# Altium footprint library ICs And Semiconductors SMD.PcbLib: 602 footprints (part 26 of 38)
Each footprint in its own frame and in the unit in brackets; x right, y up, seen from the top. Pads: shape width x height; smd on the part's side, far side on the other; paste and mask are expansions set on the pad; w line width, h text height; cw(c..) or ccw(c..) is an arc to the next point about the centre after c.
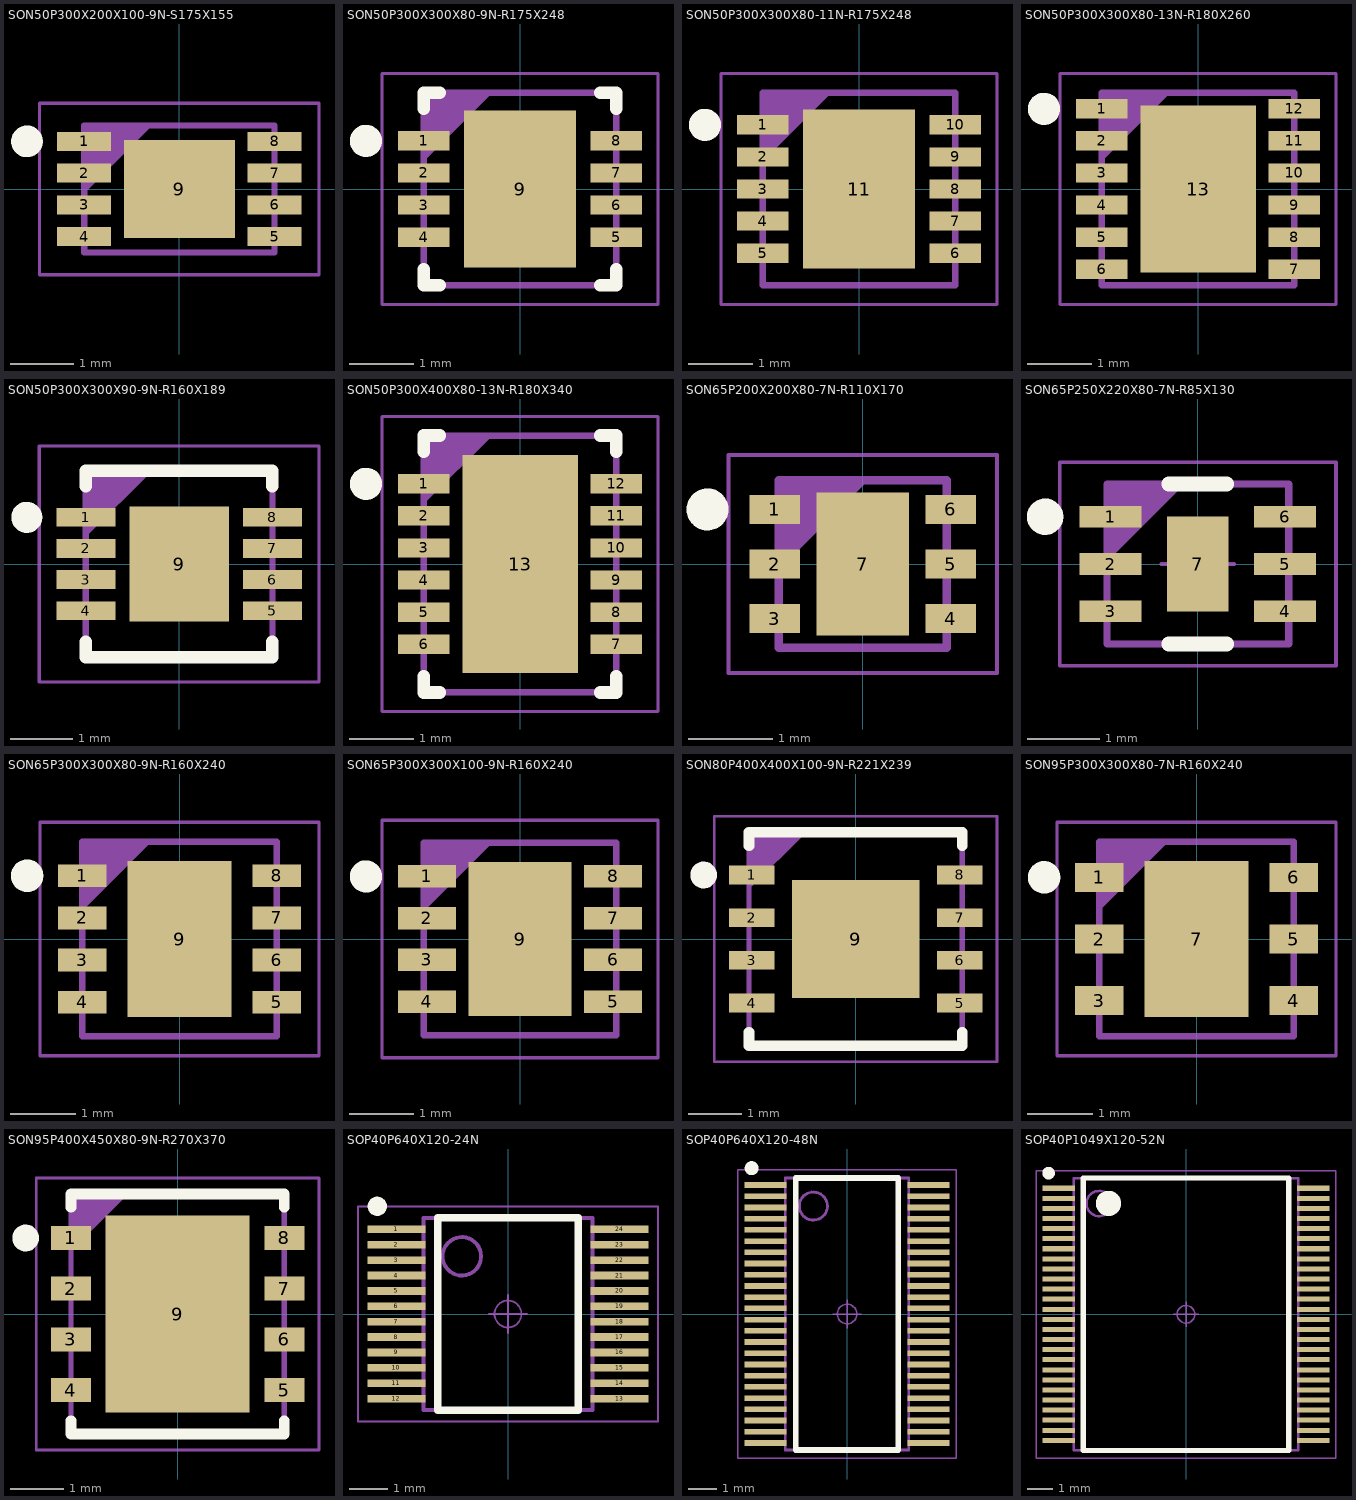
[diagram p25: the footprints below, top view; thin cyan lines are the x and y axes]

## SON50P300X200X100-9N-S175X155 [mm] "SON (DFN), 0.50mm pitch, 8 pin, 2mm X 3mm X 1.00mm H body (w/thermal tab 1.75 X 1.55mm),  IPC Medium Density"
height 1
pads (9):
  rect 0.85x0.3 smd: 1(-1.5,0.75) 2(-1.5,0.25) 3(-1.5,-0.25) 4(-1.5,-0.75) 5(1.5,-0.75) 6(1.5,-0.25) 7(1.5,0.25) 8(1.5,0.75)
  rect 1.75x1.55 smd: 9(0,0)
Top Overlay:
  circle w0.25: c-2.4,0.75 r0.125
Mechanical 14:
  lines w0.1: -1.5,0 -0.5,1 ; -1.5,0.1 -0.6,1 ; -1.5,0.2 -0.7,1 ; -1.5,0.3 -0.8,1 ; -1.5,0.4 -0.9,1 ; -1.5,0.5 -1,1 ; -1.5,0.6 -1.1,1 ; -1.5,0.7 -1.2,1 ; -1.5,0.8 -1.3,1 ; -1.5,0.9 -1.4,1 ; -1.5,-1 1.5,-1 1.5,1 -1.5,1 -1.5,-1
Mechanical 15:
  lines w0.05: -2.2,-1.35 2.2,-1.35 2.2,1.35 -2.2,1.35 -2.2,-1.35
3D body "SON50P300X200X100-9N-S175X155.stp": height 1.02, standoff 0, extent -1.5,-1 1.5,1

## SON50P300X300X80-9N-R175X248 [mm] "SON, (DFN) 0.50mm,pitch; 8 pin,3.00mm W X 3.00mm L X 0.80mm H body (w/thermal tab 1.75 X2.48mm), IPC Medium Density"
height 0.8
pads (9):
  rect 0.8x0.3 smd: 1(-1.5,0.75) 2(-1.5,0.25) 3(-1.5,-0.25) 4(-1.5,-0.75) 5(1.5,-0.75) 6(1.5,-0.25) 7(1.5,0.25) 8(1.5,0.75)
  rect 1.75x2.45 smd: 9(0,0)
Top Overlay:
  circle w0.25: c-2.4,0.75 r0.125
  lines w0.2: -1.5,-1.25 -1.5,-1.5 -1.25,-1.5 ; -1.5,1.25 -1.5,1.5 -1.25,1.5 ; 1.25,-1.5 1.5,-1.5 1.5,-1.25 ; 1.25,1.5 1.5,1.5 1.5,1.25
Mechanical 14:
  lines w0.1: -1.5,0.5 -0.5,1.5 ; -1.5,0.6 -0.6,1.5 ; -1.5,0.7 -0.7,1.5 ; -1.5,0.8 -0.8,1.5 ; -1.5,0.9 -0.9,1.5 ; -1.5,1 -1,1.5 ; -1.5,1.1 -1.1,1.5 ; -1.5,1.2 -1.2,1.5 ; -1.5,1.3 -1.3,1.5 ; -1.5,1.4 -1.4,1.5 ; -1.5,-1.5 1.5,-1.5 1.5,1.5 -1.5,1.5 -1.5,-1.5
Mechanical 15:
  lines w0.05: -0.5,0 0.5,0 ; 0,-0.5 0,0.5 ; -2.15,-1.8 -2.15,1.8 2.15,1.8 2.15,-1.8 -2.15,-1.8
3D body "SON50P300X300X80-9N-R175X248.stp": height 0.8, standoff 0, extent -1.55,-1.55 1.55,1.55

## SON50P300X300X80-11N-R175X248 [mm] "SON, 0.50mm Pitch, 10-pin, 3.00mm W  X 3.00mm L X 0.80mm Height, (w/thermal tab 1.75 X 2.48 mm), IPC Medium Density"
height 0.8
pads (11):
  rect 0.8x0.3 smd: 1(-1.5,1) 2(-1.5,0.5) 3(-1.5,0) 4(-1.5,-0.5) 5(-1.5,-1) 6(1.5,-1) 7(1.5,-0.5) 8(1.5,0) 9(1.5,0.5) 10(1.5,1)
  rect 1.75x2.48 smd: 11(0,0)
Top Overlay:
  circle w0.25: c-2.4,1 r0.125
Mechanical 14:
  lines w0.1: -1.5,0.5 -0.5,1.5 ; -1.5,0.6 -0.6,1.5 ; -1.5,0.7 -0.7,1.5 ; -1.5,0.8 -0.8,1.5 ; -1.5,0.9 -0.9,1.5 ; -1.5,1 -1,1.5 ; -1.5,1.1 -1.1,1.5 ; -1.5,1.2 -1.2,1.5 ; -1.5,1.3 -1.3,1.5 ; -1.5,1.4 -1.4,1.5 ; -1.5,-1.5 1.5,-1.5 1.5,1.5 -1.5,1.5 -1.5,-1.5
Mechanical 15:
  circle w0.05: c0,0 r0.35
  lines w0.05: -0.5,0 0.5,0 ; 0,-0.5 0,0.5 ; -2.15,-1.8 -2.15,1.8 2.15,1.8 2.15,-1.8 -2.15,-1.8
3D body "SON50P300X300X80-11N-R175X248.stp": height 0.8, standoff 0, extent -1.5,-1.5 1.5,1.5

## SON50P300X300X80-13N-R180X260 [mm] "SON, 0.50mm Pitch, 12-Pin, 3.00mm W  X 3.00mm L X 0.80mm Height, (w/Thermal Tab 1.8 X 2.6 mm), IPC Medium Density"
height 0.8
pads (13):
  rect 0.8x0.3 smd: 1(-1.5,1.25) 2(-1.5,0.75) 3(-1.5,0.25) 4(-1.5,-0.25) 5(-1.5,-0.75) 6(-1.5,-1.25) 7(1.5,-1.25) 8(1.5,-0.75) 9(1.5,-0.25) 10(1.5,0.25) 11(1.5,0.75) 12(1.5,1.25)
  rect 1.8x2.6 smd: 13(0,0)
Top Overlay:
  circle w0.25: c-2.4,1.25 r0.125
Mechanical 14:
  lines w0.1: -1.5,0.5 -0.5,1.5 ; -1.5,0.6 -0.6,1.5 ; -1.5,0.7 -0.7,1.5 ; -1.5,0.8 -0.8,1.5 ; -1.5,0.9 -0.9,1.5 ; -1.5,1 -1,1.5 ; -1.5,1.1 -1.1,1.5 ; -1.5,1.2 -1.2,1.5 ; -1.5,1.3 -1.3,1.5 ; -1.5,1.4 -1.4,1.5 ; -1.5,-1.5 -1.5,1.5 1.5,1.5 1.5,-1.5 -1.5,-1.5
Mechanical 15:
  circle w0.05: c0,0 r0.35
  lines w0.05: -0.5,0 0.5,0 ; 0,-0.5 0,0.5 ; -2.15,-1.8 2.15,-1.8 2.15,1.8 -2.15,1.8 -2.15,-1.8
3D body "SON50P300X300X80-13N-R180X260.stp": height 0.8, standoff 0, extent -1.55,-1.55 1.55,1.55

## SON50P300X300X90-9N-R160X189 [mm] "SON (DFN), 0.50mm pitch, 8 pin, 3mm X 3mm X 0.9mm H body (w/thermal tab 1.6 X 1.89mm),  IPC Medium Density"
height 0.9
pads (9):
  rect 0.95x0.3 smd: 1(-1.5,0.75) 2(-1.5,0.25) 3(-1.5,-0.25) 4(-1.5,-0.75) 5(1.5,-0.75) 6(1.5,-0.25) 7(1.5,0.25) 8(1.5,0.75)
  rect 1.6x1.85 smd: 9(0,0)
Top Overlay:
  circle w0.25: c-2.45,0.75 r0.125
  lines w0.2: -1.5,-1.25 -1.5,-1.5 1.5,-1.5 1.5,-1.25 ; -1.5,1.25 -1.5,1.5 1.5,1.5 1.5,1.25
Mechanical 14:
  lines w0.1: -1.5,0.5 -0.5,1.5 ; -1.5,0.6 -0.6,1.5 ; -1.5,0.7 -0.7,1.5 ; -1.5,0.8 -0.8,1.5 ; -1.5,0.9 -0.9,1.5 ; -1.5,1 -1,1.5 ; -1.5,1.1 -1.1,1.5 ; -1.5,1.2 -1.2,1.5 ; -1.5,1.3 -1.3,1.5 ; -1.5,1.4 -1.4,1.5 ; -1.5,-1.5 -1.5,1.5 1.5,1.5 1.5,-1.5 -1.5,-1.5
Mechanical 15:
  lines w0.05: -0.5,0 0.5,0 ; 0,-0.5 0,0.5 ; -2.25,-1.9 2.25,-1.9 2.25,1.9 -2.25,1.9 -2.25,-1.9
3D body "SON50P300X300X90-9N-R160X189.stp": height 0.9, standoff 0, extent -1.625,-1.625 1.625,1.625

## SON50P300X400X80-13N-R180X340 [mm] "SON, (DFN) 0.50mm,pitch;12 pin,3.00mm W X 4.00mm L X 0.80mm H body (w/thermal tab 1.8 X3.4mm), IPC Medium Density"
height 0.8
pads (13):
  rect 0.8x0.3 smd: 1(-1.5,1.25) 2(-1.5,0.75) 3(-1.5,0.25) 4(-1.5,-0.25) 5(-1.5,-0.75) 6(-1.5,-1.25) 7(1.5,-1.25) 8(1.5,-0.75) 9(1.5,-0.25) 10(1.5,0.25) 11(1.5,0.75) 12(1.5,1.25)
  rect 1.8x3.4 smd: 13(0,0)
Top Overlay:
  circle w0.25: c-2.4,1.25 r0.125
  lines w0.2: -1.5,-1.75 -1.5,-2 -1.25,-2 ; -1.5,1.75 -1.5,2 -1.25,2 ; 1.25,-2 1.5,-2 1.5,-1.75 ; 1.25,2 1.5,2 1.5,1.75
Mechanical 14:
  lines w0.1: -1.5,1 -0.5,2 ; -1.5,1.1 -0.6,2 ; -1.5,1.2 -0.7,2 ; -1.5,1.3 -0.8,2 ; -1.5,1.4 -0.9,2 ; -1.5,1.5 -1,2 ; -1.5,1.6 -1.1,2 ; -1.5,1.7 -1.2,2 ; -1.5,1.8 -1.3,2 ; -1.5,1.9 -1.4,2 ; -1.5,-2 -1.5,2 1.5,2 1.5,-2 -1.5,-2
Mechanical 15:
  lines w0.05: -0.5,0 0.5,0 ; 0,-0.5 0,0.5 ; -2.15,-2.3 -2.15,2.3 2.15,2.3 2.15,-2.3 -2.15,-2.3
3D body "SON50P300X400X80-13N-R180X340.stp": height 0.8, standoff 0, extent -1.55,-2.05 1.55,2.05

## SON65P200X200X80-7N-R110X170 [mm] "SON, 0.65mm, Pitch; 6 Pin,2.00mm W X 2.00mm L X 0.80mm H body (W/Thermal Tab 1.1mm X 1.7mm),  IPC Medium Density"
height 0.8
pads (7):
  rect 0.6x0.35 smd: 1(-1.05,0.65) 2(-1.05,0) 3(-1.05,-0.65) 4(1.05,-0.65) 5(1.05,0) 6(1.05,0.65)
  rect 1.1x1.7 smd: 7(0,0)
Top Overlay:
  circle w0.25: c-1.85,0.65 r0.125
Top Paste:
  region: -0.308,0.608 0.307,0.608 0.307,-0.607 -0.308,-0.607
Mechanical 14:
  lines w0.1: -1,0 0,1 ; -1,0.1 -0.1,1 ; -1,0.2 -0.2,1 ; -1,0.3 -0.3,1 ; -1,0.4 -0.4,1 ; -1,0.5 -0.5,1 ; -1,0.6 -0.6,1 ; -1,0.7 -0.7,1 ; -1,0.8 -0.8,1 ; -1,0.9 -0.9,1 ; -1,-1 1,-1 1,1 -1,1 -1,-1
Mechanical 15:
  circle w0.05: c0,0 r0.35
  lines w0.05: -0.5,0 0.5,0 ; 0,-0.5 0,0.5 ; -1.6,-1.3 -1.6,1.3 1.6,1.3 1.6,-1.3 -1.6,-1.3
3D body "SON65P200X200X80-7N-R110X170.stp": height 0.77, standoff 0, extent -1.05,-1.05 1.05,1.05

## SON65P250X220X80-7N-R85X130 [mm] "SON, 0.65mm, Pitch; 6 Pin, 2.50mm W X 2.20mm L X 0.80mm H Body (W/Thermal Tab 0.75 X 1.2mm) (w/pullback leads),  IPC Medium Density"
height 0.8
pads (7):
  rect 0.85x0.3 smd: 1(-1.2,0.65) 2(-1.2,0) 3(-1.2,-0.65) 4(1.2,-0.65) 5(1.2,0) 6(1.2,0.65)
  rect 0.85x1.3 smd: 7(0,0)
Top Overlay:
  circle w0.25: c-2.1,0.65 r0.125
  lines w0.2: -0.4,-1.1 0.4,-1.1 ; -0.4,1.1 0.4,1.1
Mechanical 14:
  lines w0.1: -1.25,0.1 -0.25,1.1 ; -1.25,0.2 -0.35,1.1 ; -1.25,0.3 -0.45,1.1 ; -1.25,0.4 -0.55,1.1 ; -1.25,0.5 -0.65,1.1 ; -1.25,0.6 -0.75,1.1 ; -1.25,0.7 -0.85,1.1 ; -1.25,0.8 -0.95,1.1 ; -1.25,0.9 -1.05,1.1 ; -1.25,1 -1.15,1.1 ; -1.25,-1.1 1.25,-1.1 1.25,1.1 -1.25,1.1 -1.25,-1.1
Mechanical 15:
  circle w0.05: c0,0 r0.35
  lines w0.05: -0.5,0 0.5,0 ; 0,-0.5 0,0.5 ; -1.9,-1.4 1.9,-1.4 1.9,1.4 -1.9,1.4 -1.9,-1.4
3D body "SON65P250X220X80-7N-R85X130.stp": height 0.8, standoff 0, extent -1.3,-1.15 1.3,1.15

## SON65P300X300X80-9N-R160X240 [mm] "SON, 0.65mm pitch, 8 pin, 3mm X 3mm X 0.80mm H body (w/thermal tab 1.60 X 2.4mm),  IPC Medium Density"
height 0.8
pads (9):
  rect 0.75x0.35 smd: 1(-1.5,0.975) 2(-1.5,0.325) 3(-1.5,-0.325) 4(-1.5,-0.975) 5(1.5,-0.975) 6(1.5,-0.325) 7(1.5,0.325) 8(1.5,0.975)
  rect 1.6x2.4 smd paste-0.35: 9(0,0)
Top Overlay:
  circle w0.25: c-2.35,0.975 r0.125
Mechanical 14:
  lines w0.1: -1.5,0.5 -0.5,1.5 ; -1.5,0.6 -0.6,1.5 ; -1.5,0.7 -0.7,1.5 ; -1.5,0.8 -0.8,1.5 ; -1.5,0.9 -0.9,1.5 ; -1.5,1 -1,1.5 ; -1.5,1.1 -1.1,1.5 ; -1.5,1.2 -1.2,1.5 ; -1.5,1.3 -1.3,1.5 ; -1.5,1.4 -1.4,1.5 ; -1.5,-1.5 1.5,-1.5 1.5,1.5 -1.5,1.5 -1.5,-1.5
Mechanical 15:
  circle w0.05: c0,0 r0.35
  lines w0.05: -0.5,0 0.5,0 ; 0,-0.5 0,0.5 ; -2.15,-1.8 -2.15,1.8 2.15,1.8 2.15,-1.8 -2.15,-1.8
3D body "SON65P300X300X80-9N-R160X240.stp": height 0.8, standoff 0, extent -1.5,-1.5 1.5,1.5

## SON65P300X300X100-9N-R160X240 [mm] "SON, 0.65mm pitch, 8 pin, 3mm X 3mm X 1.00mm H body (w/thermal tab 1.60 X 2.4mm),  IPC Medium Density"
height 1
pads (9):
  rect 0.9x0.35 smd: 1(-1.45,0.975) 2(-1.45,0.325) 3(-1.45,-0.325) 4(-1.45,-0.975) 5(1.45,-0.975) 6(1.45,-0.325) 7(1.45,0.325) 8(1.45,0.975)
  rect 1.6x2.4 smd: 9(0,0)
Top Overlay:
  circle w0.25: c-2.4,0.975 r0.125
Mechanical 14:
  lines w0.1: -1.5,0.5 -0.5,1.5 ; -1.5,0.6 -0.6,1.5 ; -1.5,0.7 -0.7,1.5 ; -1.5,0.8 -0.8,1.5 ; -1.5,0.9 -0.9,1.5 ; -1.5,1 -1,1.5 ; -1.5,1.1 -1.1,1.5 ; -1.5,1.2 -1.2,1.5 ; -1.5,1.3 -1.3,1.5 ; -1.5,1.4 -1.4,1.5 ; -1.5,-1.5 -1.5,1.5 1.5,1.5 1.5,-1.5 -1.5,-1.5
Mechanical 15:
  circle w0.05: c0,0 r0.35
  lines w0.05: -0.5,0 0.5,0 ; 0,-0.5 0,0.5 ; -2.15,-1.85 2.15,-1.85 2.15,1.85 -2.15,1.85 -2.15,-1.85
3D body "SON65P300X300X100-9N-R160X240.stp": height 1, standoff 0, extent -1.5,-1.5 1.5,1.5

## SON80P400X400X100-9N-R221X239 [mm] "SON, 0.80mm Pitch, 8 Pin, 4mm X 4mm X 1.00mm H Body (w/Thermal Tab 2.21 X 2.39mm),  IPC Medium Density"
height 1
pads (9):
  rect 0.85x0.35 smd: 1(-1.95,1.2) 2(-1.95,0.4) 3(-1.95,-0.4) 4(-1.95,-1.2) 5(1.95,-1.2) 6(1.95,-0.4) 7(1.95,0.4) 8(1.95,1.2)
  rect 2.39x2.21 smd: 9(0,0)
Top Overlay:
  circle w0.25: c-2.85,1.2 r0.125
  lines w0.2: -2,-1.75 -2,-2 2,-2 2,-1.75 ; -2,1.75 -2,2 2,2 2,1.75
Mechanical 14:
  lines w0.1: -2,1 -1,2 ; -2,1.1 -1.1,2 ; -2,1.2 -1.2,2 ; -2,1.3 -1.3,2 ; -2,1.4 -1.4,2 ; -2,1.5 -1.5,2 ; -2,1.6 -1.6,2 ; -2,1.7 -1.7,2 ; -2,1.8 -1.8,2 ; -2,1.9 -1.9,2 ; -2,-2 -2,2 2,2 2,-2 -2,-2
Mechanical 15:
  circle w0.05: c0,0 r0.35
  lines w0.05: -0.5,0 0.5,0 ; 0,-0.5 0,0.5 ; -2.65,-2.3 2.65,-2.3 2.65,2.3 -2.65,2.3 -2.65,-2.3
3D body "SON80P400X400X100-9N-R221X239.stp": height 1, standoff 0, extent -2,-2 2,2

## SON95P300X300X80-7N-R160X240 [mm] "SON, 0.95mm Pitch; 6 Pin, 3.00mm W X 3mm L X 0.80mm H body (w/Thermal Tab 1.6mm x 2.4mm)"
height 0.8
pads (7):
  rect 0.75x0.45 smd: 1(-1.5,0.95) 2(-1.5,0) 3(-1.5,-0.95) 4(1.5,-0.95) 5(1.5,0) 6(1.5,0.95)
  rect 1.6x2.4 smd: 7(0,0)
Top Overlay:
  circle w0.25: c-2.35,0.95 r0.125
Mechanical 14:
  lines w0.1: -1.5,0.5 -0.5,1.5 ; -1.5,0.6 -0.6,1.5 ; -1.5,0.7 -0.7,1.5 ; -1.5,0.8 -0.8,1.5 ; -1.5,0.9 -0.9,1.5 ; -1.5,1 -1,1.5 ; -1.5,1.1 -1.1,1.5 ; -1.5,1.2 -1.2,1.5 ; -1.5,1.3 -1.3,1.5 ; -1.5,1.4 -1.4,1.5 ; -1.5,-1.5 1.5,-1.5 1.5,1.5 -1.5,1.5 -1.5,-1.5
Mechanical 15:
  circle w0.05: c0,0 r0.35
  lines w0.05: -0.5,0 0.5,0 ; 0,-0.5 0,0.5 ; -2.15,-1.8 -2.15,1.8 2.15,1.8 2.15,-1.8 -2.15,-1.8
3D body "SON95P300X300X80-7N-R160X240.stp": height 0.8, standoff 0, extent -1.55,-1.55 1.55,1.55

## SON95P400X450X80-9N-R270X370 [mm] "SON, 0.95mm Pitch; 8 Pin, 4.00mm W X 4.50mm L X 0.80mm H body (w/Thermal Tab 2.7mm x 3.7mm)"
height 0.8
pads (9):
  rect 0.75x0.45 smd: 1(-2,1.425) 2(-2,0.475) 3(-2,-0.475) 4(-2,-1.425) 5(2,-1.425) 6(2,-0.475) 7(2,0.475) 8(2,1.425)
  rect 2.7x3.7 smd paste-0.57: 9(0,0)
Top Overlay:
  circle w0.25: c-2.85,1.425 r0.125
  lines w0.2: -2,-2 -2,-2.25 2,-2.25 2,-2 ; -2,2 -2,2.25 2,2.25 2,2
Mechanical 14:
  lines w0.1: -2,1.25 -1,2.25 ; -2,1.35 -1.1,2.25 ; -2,1.45 -1.2,2.25 ; -2,1.55 -1.3,2.25 ; -2,1.65 -1.4,2.25 ; -2,1.75 -1.5,2.25 ; -2,1.85 -1.6,2.25 ; -2,1.95 -1.7,2.25 ; -2,2.05 -1.8,2.25 ; -2,2.15 -1.9,2.25 ; -2,-2.25 2,-2.25 2,2.25 -2,2.25 -2,-2.25
Mechanical 15:
  circle w0.05: c0,0 r0.35
  lines w0.05: -0.5,0 0.5,0 ; 0,-0.5 0,0.5 ; -2.65,-2.55 2.65,-2.55 2.65,2.55 -2.65,2.55 -2.65,-2.55
3D body "SON95P400X450X80-9N-R270X370.stp": height 0.8, standoff 0, extent -2.05,-2.3 2.05,2.3

## SOP40P640X120-24N [mm] "SOP, 0.40mm Pitch; 24 pin, 4.40mm W X 5.00mm L X 1.20mm H Body, IPC Medium Density"
height 1.2
pads (24):
  rect 1.5x0.2 smd: 1(-2.9,2.2) 2(-2.9,1.8) 3(-2.9,1.4) 4(-2.9,1) 5(-2.9,0.6) 6(-2.9,0.2) 7(-2.9,-0.2) 8(-2.9,-0.6) 9(-2.9,-1) 10(-2.9,-1.4) 11(-2.9,-1.8) 12(-2.9,-2.2) 13(2.9,-2.2) 14(2.9,-1.8) 15(2.9,-1.4) 16(2.9,-1) 17(2.9,-0.6) 18(2.9,-0.2) 19(2.9,0.2) 20(2.9,0.6) 21(2.9,1) 22(2.9,1.4) 23(2.9,1.8) 24(2.9,2.2)
Top Overlay:
  circle w0.25: c-3.4,2.8 r0.125
  lines w0.2: -1.825,-2.5 1.825,-2.5 1.825,2.5 -1.825,2.5 -1.825,-2.5
Mechanical 14:
  circle w0.1: c-1.2,1.5 r0.5
  lines w0.1: -2.2,-2.5 2.2,-2.5 2.2,2.5 -2.2,2.5 -2.2,-2.5
Mechanical 15:
  circle w0.05: c0,0 r0.35
  lines w0.05: -0.5,0 0.5,0 ; 0,-0.5 0,0.5 ; -3.9,-2.8 3.9,-2.8 3.9,2.8 -3.9,2.8 -3.9,-2.8
3D body "SOP40P640X120-24N.stp": height 1.2, standoff 0, extent -3.3,-2.5 3.3,2.5

## SOP40P640X120-48N [mm] "SOP, 0.40mm Pitch; 48 Pin, 4.40mm W X 9.70mm L X 1.20mm H Body, IPC Medium Density"
height 1.2
pads (48):
  rect 1.5x0.2 smd: 1(-2.9,4.6) 2(-2.9,4.2) 3(-2.9,3.8) 4(-2.9,3.4) 5(-2.9,3) 6(-2.9,2.6) 7(-2.9,2.2) 8(-2.9,1.8) 9(-2.9,1.4) 10(-2.9,1) 11(-2.9,0.6) 12(-2.9,0.2) 13(-2.9,-0.2) 14(-2.9,-0.6) 15(-2.9,-1) 16(-2.9,-1.4) 17(-2.9,-1.8) 18(-2.9,-2.2) 19(-2.9,-2.6) 20(-2.9,-3) 21(-2.9,-3.4) 22(-2.9,-3.8) 23(-2.9,-4.2) 24(-2.9,-4.6) 25(2.9,-4.6) 26(2.9,-4.2) 27(2.9,-3.8) 28(2.9,-3.4) 29(2.9,-3) 30(2.9,-2.6) 31(2.9,-2.2) 32(2.9,-1.8) 33(2.9,-1.4) 34(2.9,-1) 35(2.9,-0.6) 36(2.9,-0.2) 37(2.9,0.2) 38(2.9,0.6) 39(2.9,1) 40(2.9,1.4) 41(2.9,1.8) 42(2.9,2.2) 43(2.9,2.6) 44(2.9,3) 45(2.9,3.4) 46(2.9,3.8) 47(2.9,4.2) 48(2.9,4.6)
Top Overlay:
  circle w0.25: c-3.4,5.2 r0.125
  lines w0.2: -1.825,-4.85 -1.825,4.85 1.825,4.85 1.825,-4.85 -1.825,-4.85
Mechanical 14:
  circle w0.1: c-1.2,3.85 r0.5
  lines w0.1: -2.2,-4.85 -2.2,4.85 2.2,4.85 2.2,-4.85 -2.2,-4.85
Mechanical 15:
  circle w0.05: c0,0 r0.35
  lines w0.05: -0.5,0 0.5,0 ; 0,-0.5 0,0.5 ; -3.9,-5.15 -3.9,5.15 3.9,5.15 3.9,-5.15 -3.9,-5.15
3D body "SOP40P640X120-48N.stp": height 1.2, standoff 0, extent -3.3,-4.85 3.3,4.85

## SOP40P1049X120-52N [mm] "SOP, 0.40mm Pitch; 52 Pin, 8.89mm W X 10.79mm L X 1.20mm H Body, IPC Medium Density"
height 1.2
pads (52):
  rect 1.3x0.2 smd: 1(-5.05,5) 2(-5.05,4.6) 3(-5.05,4.2) 4(-5.05,3.8) 5(-5.05,3.4) 6(-5.05,3) 7(-5.05,2.6) 8(-5.05,2.2) 9(-5.05,1.8) 10(-5.05,1.4) 11(-5.05,1) 12(-5.05,0.6) 13(-5.05,0.2) 14(-5.05,-0.2) 15(-5.05,-0.6) 16(-5.05,-1) 17(-5.05,-1.4) 18(-5.05,-1.8) 19(-5.05,-2.2) 20(-5.05,-2.6) 21(-5.05,-3) 22(-5.05,-3.4) 23(-5.05,-3.8) 24(-5.05,-4.2) 25(-5.05,-4.6) 26(-5.05,-5) 27(5.05,-5) 28(5.05,-4.6) 29(5.05,-4.2) 30(5.05,-3.8) 31(5.05,-3.4) 32(5.05,-3) 33(5.05,-2.6) 34(5.05,-2.2) 35(5.05,-1.8) 36(5.05,-1.4) 37(5.05,-1) 38(5.05,-0.6) 39(5.05,-0.2) 40(5.05,0.2) 41(5.05,0.6) 42(5.05,1) 43(5.05,1.4) 44(5.05,1.8) 45(5.05,2.2) 46(5.05,2.6) 47(5.05,3) 48(5.05,3.4) 49(5.05,3.8) 50(5.05,4.2) 51(5.05,4.6) 52(5.05,5)
Top Overlay:
  circle w0.25: c-5.45,5.6 r0.125
  circle w0.5: c-3.075,4.4 r0.25
  lines w0.2: -4.075,-5.4 -4.075,5.4 4.075,5.4 4.075,-5.4 -4.075,-5.4
Mechanical 14:
  circle w0.1: c-3.445,4.395 r0.5
  lines w0.1: -4.445,-5.395 -4.445,5.395 4.445,5.395 4.445,-5.395 -4.445,-5.395
Mechanical 15:
  circle w0.05: c0,0 r0.35
  lines w0.05: -0.5,0 0.5,0 ; 0,-0.5 0,0.5 ; -5.95,-5.7 -5.95,5.7 5.95,5.7 5.95,-5.7 -5.95,-5.7
3D body "SOP40P1049X120-52N.stp": height 1.2, standoff 0, extent -5.256,-5.395 5.256,5.395